# Altium footprint library XU-GENARAL PCB .PcbLib: 1176 footprints (part 2 of 75)
Each footprint in its own frame and in the unit in brackets; x right, y up, seen from the top. Pads: shape width x height; smd on the part's side, far side on the other; paste and mask are expansions set on the pad; w line width, h text height; cw(c..) or ccw(c..) is an arc to the next point about the centre after c.
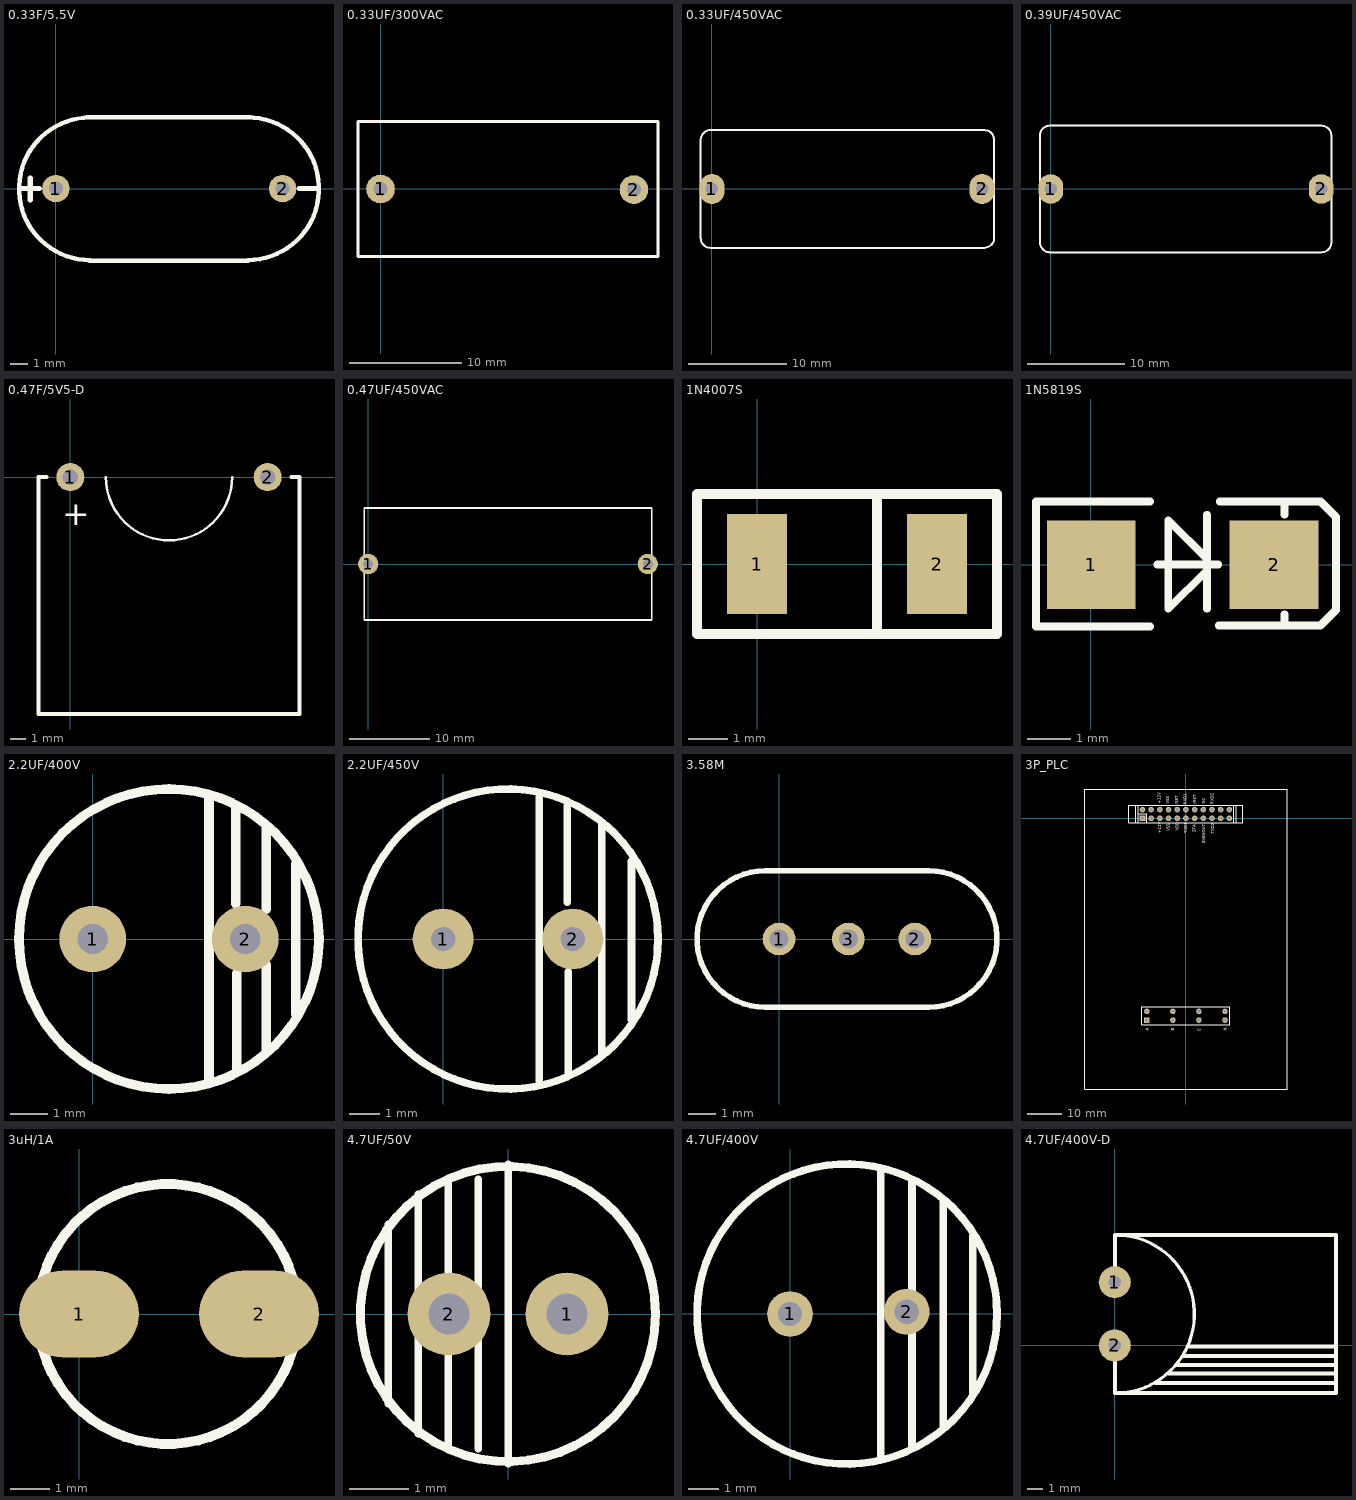
[diagram p1: the footprints below, top view; thin cyan lines are the x and y axes]

## 0.33F/5.5V [mil]
pads (2):
  round 62 hole 32: 1(0,0) 2(513,0)
Top Overlay:
  lines w10: 69.74,161 441,161 ; 76,-163 435,-163 ; 78,-162 cw(c78,-0.58) 78,160.83 ; 434,-161.83 ccw(c434,-0.42) 434,161
  lines w12: -80.74,0 -37,0 ; -58,-26 -58,24 ; 550.26,0 594,0

## 0.33UF/300VAC [mil]
pads (2):
  round 100 hole 50: 1(0,0) 2(886,-2)
Top Overlay:
  lines w10: -78.74,-236.22 970.14,-236.22 970.14,236.22 -78.74,236.22 -78.74,-236.22

## 0.33UF/450VAC [mil]
pads (2):
  oval 100x120 hole 50: 1(0,0) 2(1084,0)
Top Overlay:
  lines w8: -5.89,235.97 1093.42,235.96 cw(c1093.55,196.72) 1132.79,196.85 1132.79,-196.85 ; -5,236 ccw(c-5.55,196.3) -45.26,196.85 -45.26,-196.85 ccw(c-5.76,-196.98) -5.89,-236.48 1093.42,-236.48 ccw(c1091.87,-195.55) 1132.79,-194

## 0.39UF/450VAC [mil]
pads (2):
  oval 100x120 hole 50: 1(0,0) 2(1093,0)
Top Overlay:
  lines w8: -4.63,-255.91 1094.68,-255.91 ; -2,-255.91 cw(c-3.31,-215.22) -44,-216.53 -44,216.53 cw(c-4.63,216.53) -4.63,255.91 1094.68,255.91 cw(c1094.68,216.53) 1134.05,216.53 1134.05,-216.53 cw(c1094.34,-216.2) 1094,-255.91

## 0.47F/5V5-D [mil]
pads (2):
  round 70 hole 38: 1(0,0) 2(492.13,0)
Top Overlay:
  lines w6: 88.58,0 ccw(c246.06,0) 403.54,0
  lines w10: -59.05,0 -78.74,0 -78.74,-590.55 570.87,-590.55 570.87,0 551.18,0
  text "+" at -20,-120 h60

## 0.47UF/450VAC [mm]
pads (2):
  round 2.54 hole 1.27: 1(0,0) 2(35,0)
Top Overlay:
  lines w0.203: -0.5,-7 -0.5,7 35.5,7 35.5,-7 -0.5,-7

## 1N4007S [mil]
pads (2):
  rect 60x100 smd: 1(0,0) 2(180,0)
Top Overlay:
  lines w10: 120,-70 120,70 ; -60,-70 -60,70 240,70 240,-70 -60,-70

## 1N5819S [mil]
pads (2):
  rect 80x80 smd: 1(0.42,0) 2(165.43,0)
Top Overlay:
  lines w7: 53.42,-56 -49.58,-56 -49.58,57 53.42,57 ; 60,0 115,0 ; 105,-40 105,45 ; 105,-5 70,-40 70,40 105,5 ; 115.42,-55 207.43,-55 221.43,-41 221.43,43 207.43,57 116.42,57 ; 175,-55 175,-45 ; 175,45 175,57

## 2.2UF/400V [mil]
pads (2):
  round 70 hole 32: 1(0,0) 2(160,0)
Top Overlay:
  circle w10: c80,0 r157.48
  lines w10: 122,-151 122,149 ; 150,37 150,139 ; 151,-140 151,-36 ; 182,-118 182,-27 ; 182,31 182,116 ; 213,-79 213,79

## 2.2UF/450V [mil]
pads (2):
  round 80 hole 32: 1(0,0) 2(170,0)
Top Overlay:
  circle w10: c85,0 r196.85
  lines w10: 126,-191 126,191 ; 163,48 163,175 ; 164,-176 164,-43 ; 208,-149 208,150 ; 247,-106 247,102

## 3.58M [mm]
pads (3):
  round 1.2 hole 0.7: 1(0,0) 2(4.98,0) 3(2.54,0)
Top Overlay:
  lines w0.2: -0.508,-2.5 cw(c-0.508,0) -0.508,2.5 5.488,2.5 cw(c5.488,0) 5.488,-2.5 -0.508,-2.5

## 3P_PLC [mil]
pads (30):
  rect 64x64 hole 40: 0(-500,0)
  round 64 hole 40: 0(-500,100) 0(-400,100) 0(-400,0) 0(300,0) 0(300,100) 0(400,0) 0(400,100) 0(500,0) 0(500,100) 21(200,0) 22(200,100) 24(100,100) 25(0,0) 26(0,100) 27(-100,0) 28(-100,100) 29(-200,0) 30(-200,100) 31(-300,0) 32(-300,100)
  rect 64x64 hole 41.81: 1(-450,-2322.84)
  round 62 hole 35.43: 2(-450.39,-2222.84) 8(-150.39,-2222.84) 20(449.61,-2222.84)
  round 64 hole 41.81: 7(-150,-2322.84) 13(150,-2322.84) 14(150,-2222.84) 19(450,-2322.84)
  round 62 hole 31.5: 23(100,0)
Top Overlay:
  lines w10: -550,50 -450,50 -450,-50 ; -578.74,-50.63 -656.71,-50.63 -657.48,-49.86 -657.48,150.07 -657.41,150 -578.67,150 ; -578.74,-50.63 -578.11,-50 -550,-50 ; -578.74,-50.63 -578.74,150.07 -578.67,150 ; -578.67,150 -550,150 ; -550,-50 -550,150 ; -550,-50 549,-50 ; -550,150 549,150 ; 503.74,-2168.31 503.74,-2375 494.88,-2375 -507.09,-2375 -507.09,-2167.32 -506.1,-2168.31 494.88,-2168.31 503.74,-2168.31 ; 503.74,-2168.31 503.74,-2168.31 ; 549,-50 576.2,-50 ; 549,-50 549,150 ; 549,150 577.56,150 ; 576.2,-50 655.45,-50 656.48,-51.03 656.48,148.83 655.31,150 577.56,150 ; 576.2,-50 577.74,-48.46 577.74,149.82 577.56,150 ; -1167,-3116 1169,-3116 1169,337 -1167,337 -1167,-3116
  text "VDD" at -85,-145 h35
  text "/SET" at -90,155 h35
  text "+12V" at -290,165 h35
  text "+12V" at -285,-170 h35
  text "VSS" at -190,165 h35
  text "VSS" at -185,-150 h35
  text "TXD1" at 15,-170 h35
  text "RXD1" at 10,155 h35
  text "STA" at 115,-160 h35
  text "/RST" at 120,160 h35
  text "RXD2" at 320,160 h35
  text "TXD2" at 325,-180 h35
  text "EVENOUT" at 225,-285 h35
  text "NC" at 220,170 h35
  text "A" at -430,-2445 h35
  text "B" at -135,-2445 h35
  text "C" at 170,-2450 h35
  text "N" at 470,-2445 h35

## 3uH/1A [mil]
pads (2):
  oval 120x86.61 smd: 1(0,0) 2(180,0)
Top Overlay:
  circle w10: c88.74,0 r129.92

## 4.7UF/50V [mm]
pads (2):
  round 1.4 hole 0.7: 1(1,0) 2(-1,0)
Top Overlay:
  circle w0.152: c0,0 r2.5
  rectangle: -1.016,-2.032 -1.016,2.032
  lines w0.127: -2.032,-1.524 -2.032,1.524 ; -1.524,-2.032 -1.524,2.032 ; -1.016,-2.286 -1.016,-2.032 -1.016,2.032 -1.016,2.286 ; -0.508,-2.286 -0.508,-2.032 -0.508,2.032 -0.508,2.286 ; 0,-2.54 0,2.54

## 4.7UF/400V [mil]
pads (2):
  round 60 hole 32: 1(0,0) 2(153,3)
Top Overlay:
  circle w10: c74.74,-0.06 r196.85
  lines w10: 119,-191.06 119,190.94 ; 160,-175.06 160,174.94 ; 201,-149.06 201,149.94 ; 240,-106.06 240,101.94

## 4.7UF/400V-D [mil]
pads (2):
  round 80 hole 32: 1(0,157.48) 2(0,0)
Top Overlay:
  lines w8: 1,275.59 cw(c1,78.3) 2,-119
  lines w10: 0,-36 0,-118.11 551.18,-118.11 551.18,275.59 0,275.59 0,184 ; 101,-94 550.18,-94 ; 135,-70 550.18,-70 ; 154,-49 550,-49 ; 170,-26 550.18,-26 ; 183,-3 549,-3